# Altium footprint library SMD_SEMI.PcbLib: 101 footprints (part 3 of 7)
Each footprint in its own frame and in the unit in brackets; x right, y up, seen from the top. Pads: shape width x height; smd on the part's side, far side on the other; paste and mask are expansions set on the pad; w line width, h text height; cw(c..) or ccw(c..) is an arc to the next point about the centre after c.
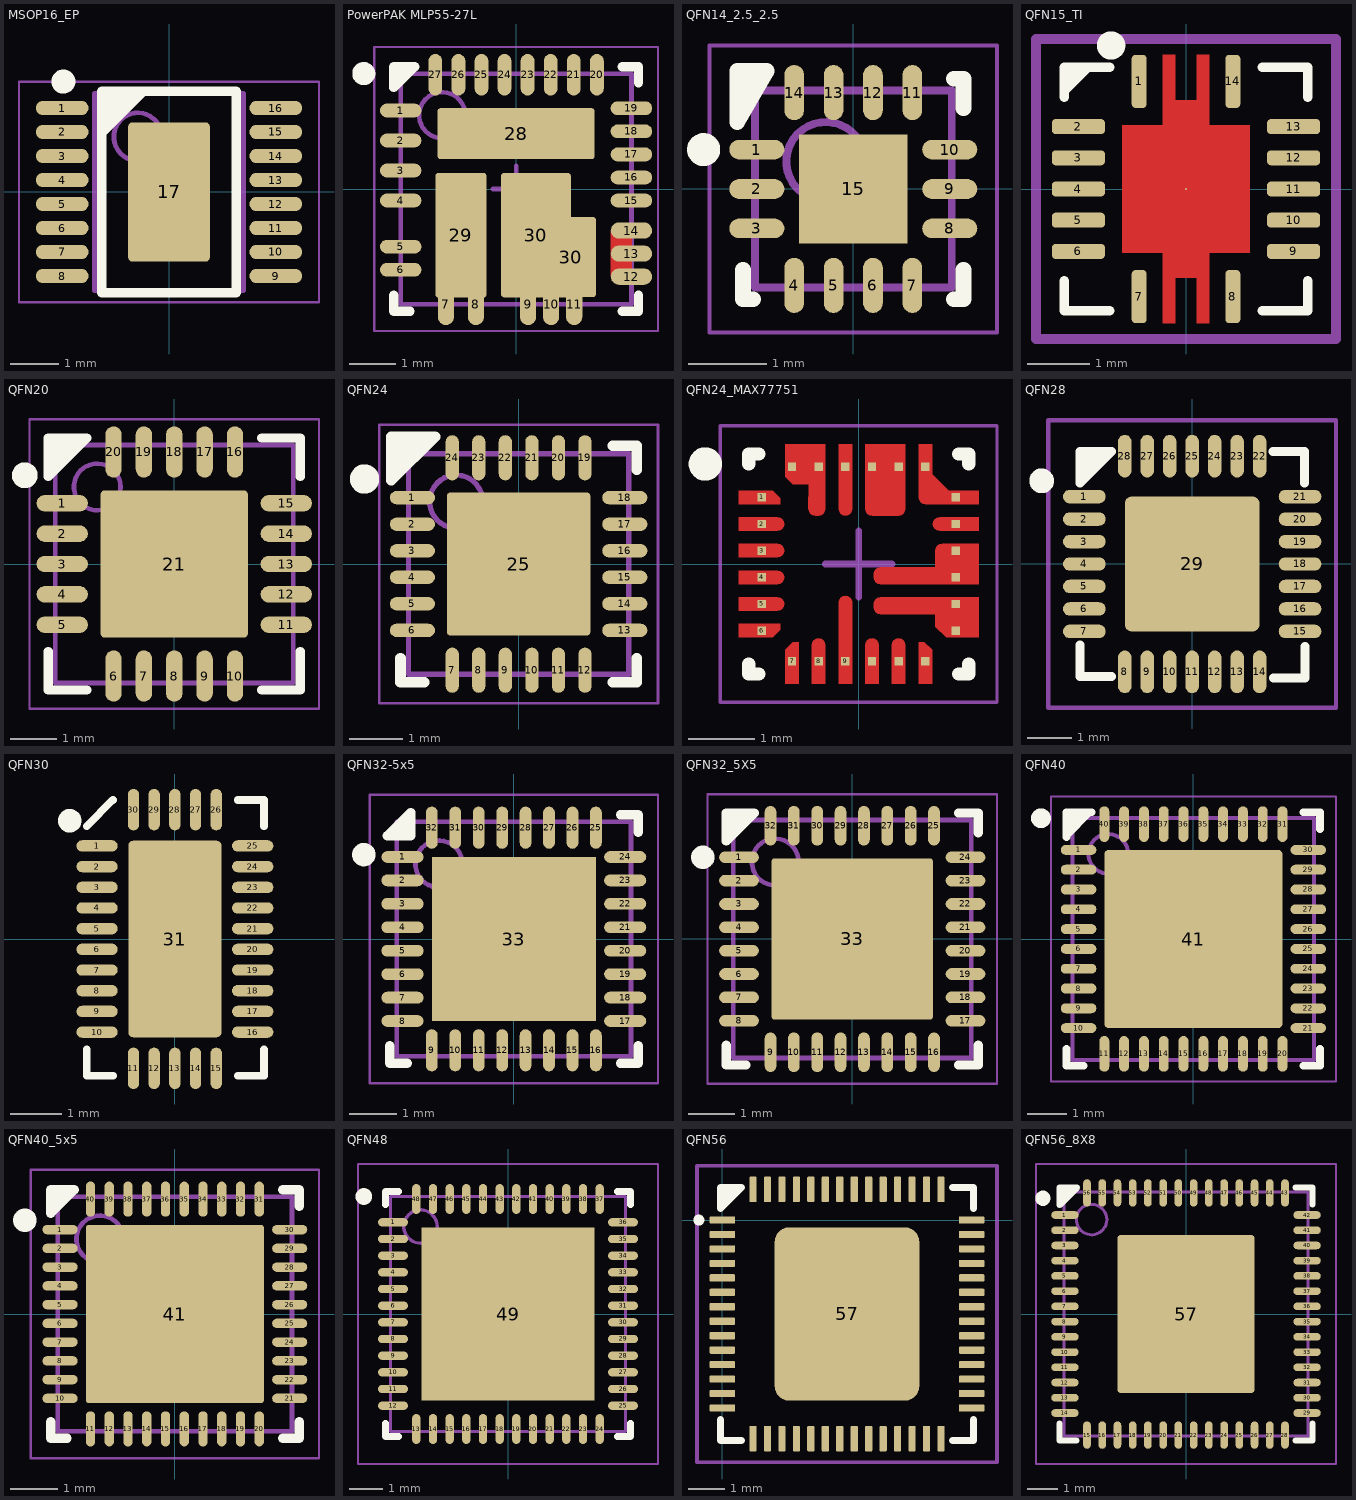
[diagram p2: the footprints below, top view; thin cyan lines are the x and y axes]

## MSOP16_EP [mm] "16-Leads, Body 4,00x3,00mm, Pitch 0,50mm"
height 0.86
pads (17):
  oval 1.1x0.3 smd: 1(-2.225,1.75) 2(-2.225,1.25) 3(-2.225,0.75) 4(-2.225,0.25) 5(-2.225,-0.25) 6(-2.225,-0.75) 7(-2.225,-1.25) 8(-2.225,-1.75) 9(2.225,-1.75) 10(2.225,-1.25) 11(2.225,-0.75) 12(2.225,-0.25) 13(2.225,0.25) 14(2.225,0.75) 15(2.225,1.25) 16(2.225,1.75)
  rrect10% 1.7x2.9 smd: 17(0,0)
Top Overlay:
  circle w0.25: c-2.2,2.3 r0.125
  region: -0.4,2.1 -1.4,1.1 -1.4,2.1
  lines w0.2: -1.4,-2.1 -1.4,2.1 1.4,2.1 1.4,-2.1 -1.4,-2.1
Mechanical 13:
  circle w0.1: c-0.65,1.15 r0.5
  lines w0.1: -1.55,-2.05 1.55,-2.05 1.55,2.05 -1.55,2.05 -1.55,-2.05
Mechanical 15:
  lines w0.05: -3.125,-2.3 3.125,-2.3 3.125,2.3 -3.125,2.3 -3.125,-2.3
  lines w0.1: -0.5,0 0.5,0 ; 0,-0.5 0,0.5
3D body "MSOP16_TP.step": height 0.86, standoff 0, extent -2.45,-2.05 2.45,2.05

## PowerPAK MLP55-27L [mm]
height 1
pads (31):
  oval 0.9x0.3 smd: 1(-2.5,1.7) 2(-2.5,1.05) 3(-2.5,0.4) 4(-2.5,-0.25) 5(-2.5,-1.25) 6(-2.5,-1.75) 15(2.5,-0.25) 16(2.5,0.25) 17(2.5,0.75) 18(2.5,1.25) 19(2.5,1.75)
  oval 0.35x0.9 smd: 7(-1.52,-2.5) 8(-0.87,-2.5) 9(0.26,-2.5) 10(0.76,-2.5) 11(1.26,-2.5)
  oval 0.9x0.35 smd: 12(2.5,-1.9) 13(2.5,-1.4) 14(2.5,-0.9)
  oval 0.3x0.9 smd: 20(1.75,2.475) 21(1.25,2.475) 22(0.75,2.475) 23(0.25,2.475) 24(-0.25,2.475) 25(-0.75,2.475) 26(-1.25,2.475) 27(-1.75,2.475)
  rrect10% 3.4x1.1 smd: 28(0,1.2)
  rrect10% 1.1x2.7 smd: 29(-1.195,-1)
  rrect10% 1.52x2.7 smd: 30(0.43,-1)
  rrect10% 1.1x1.73 smd: 30(1.18,-1.475)
Top Layer:
  rectangle: 2.05,-1.899 2.511,-0.913
Top Overlay:
  circle w0.25: c-3.3,2.5 r0.125
  rectangle: -2.65,2.425 -2.422,2.65
  lines w0.2: -2.65,-2.3 -2.65,-2.65 -2.3,-2.65 ; 2.3,-2.65 2.65,-2.65 2.65,-2.3 ; 2.3,2.65 2.65,2.65 2.65,2.3 ; -2.65,2.2 -2.65,2.65 -2.195,2.65 -2.65,2.2
Mechanical 13:
  circle w0.1: c-1.6,1.6 r0.5
  lines w0.1: -2.5,-2.5 2.5,-2.5 2.5,2.5 -2.5,2.5 -2.5,-2.5
Mechanical 15:
  lines w0.05: -3.075,-3.075 3.075,-3.075 3.075,3.075 -3.075,3.075 -3.075,-3.075
  lines w0.1: -0.5,0 0.5,0 ; 0,-0.5 0,0.5
3D body "User Library-MLP55-27L.STEP": height 0.8, standoff 0, extent -2.5,-2.5 2.501,2.5

## QFN14_2.5_2.5 [mm] "QFN, 14-Leads, Body 2.50x2.50mm, Pitch 0.50mm, Thermal Pad 1.38x1.38mm, IPC Medium Density"
height 0.8
pads (15):
  oval 0.7x0.25 smd: 1(-1.225,0.5) 2(-1.225,0) 3(-1.225,-0.5) 8(1.225,-0.5) 9(1.225,0) 10(1.225,0.5)
  oval 0.25x0.7 smd: 4(-0.75,-1.225) 5(-0.25,-1.225) 6(0.25,-1.225) 7(0.75,-1.225) 11(0.75,1.225) 12(0.25,1.225) 13(-0.25,1.225) 14(-0.75,1.225)
  rect 1.38x1.38 smd: 15(0,0)
Top Overlay:
  circle w0.25: c-1.9,0.5 r0.085
  rectangle: -1.523,1.146 -1.203,1.501
  lines w0.2: -1.4,-1.025 -1.4,-1.4 -1.275,-1.4 ; 1.275,-1.4 1.4,-1.4 1.4,-1.025 ; 1.275,1.4 1.4,1.4 1.4,1.025 ; -1.475,0.85 -1.475,1.5 -1.1,1.5 -1.475,0.85
Mechanical 13:
  circle w0.1: c-0.35,0.35 r0.5
  lines w0.1: -1.25,-1.25 1.25,-1.25 1.25,1.25 -1.25,1.25 -1.25,-1.25
Mechanical 15:
  lines w0.05: -1.825,-1.825 1.825,-1.825 1.825,1.825 -1.825,1.825 -1.825,-1.825
  lines w0.1: -0.5,0 0.5,0 ; 0,-0.5 0,0.5
3D body "QFN14_2.5_2.5.step": height 0.8, standoff 0, extent -1.3,-1.3 1.3,1.3

## QFN15_TI [mm]
pads (15):
  rrect50% 0.24x0.85 smd paste-0.412: 1(-0.75,1.725) 7(-0.75,-1.725) 8(0.75,-1.725) 14(0.75,1.725)
  rrect50% 0.85x0.24 smd paste-0.412: 2(-1.725,1) 3(-1.725,0.5) 4(-1.725,0) 5(-1.725,-0.5) 6(-1.725,-1) 9(1.725,-1) 10(1.725,-0.5) 11(1.725,0) 12(1.725,0.5) 13(1.725,1)
  round 0.025 smd paste-1.012: 15(0,0)
Top Layer:
  region: -0.375,1.025 -0.375,2.15 -0.175,2.15 -0.175,1.425 0.175,1.425 0.175,2.15 0.375,2.15 0.375,1.025 1.025,1.025 1.025,-1.025 0.375,-1.025 0.375,-2.15 0.175,-2.15 0.175,-1.425 -0.175,-1.425 -0.175,-2.15 -0.375,-2.15 -0.375,-1.025 -1.025,-1.025 -1.025,1.025
Top Overlay:
  circle w0.254: c-1.2,2.3 r0.1
  region: -1.952,1.473 -1.473,1.952 -1.952,1.952
  lines w0.152: -1.952,-1.473 -1.952,-1.952 -1.223,-1.952 ; -1.952,1.473 -1.952,1.952 -1.223,1.952 ; 1.223,-1.952 1.952,-1.952 1.952,-1.473 ; 1.223,1.952 1.952,1.952 1.952,1.473
Top Paste:
  drawing of 29 lines, arcs and shapes, not listed
Top Solder:
  region: -0.375,-1.025 0.375,-1.025 0.375,-2.15 0.175,-2.15 0.175,-1.425 -0.175,-1.425 -0.175,-2.15 -0.375,-2.15
  region: -0.375,-1.025 0.375,-1.025 0.375,-2.15 0.175,-2.15 0.175,-1.425 -0.175,-1.425 -0.175,-2.15 -0.375,-2.15
  region: -0.375,1.025 0.375,1.025 0.375,2.15 0.175,2.15 0.175,1.425 -0.175,1.425 -0.175,2.15 -0.375,2.15
  region: -0.375,1.025 0.375,1.025 0.375,2.15 0.175,2.15 0.175,1.525 -0.175,1.525 -0.175,2.15 -0.375,2.15
Mechanical 15:
  lines w0.152: -2.404,-2.404 2.404,-2.404 2.404,2.404 -2.404,2.404 -2.404,-2.404
3D body "RHL14_2P05X2P05.step": height 0.74, standoff 0, extent -1.876,-1.876 1.876,1.876

## QFN20 [mm] "QFN, 20-Leads, Body 5.00x5.00mm, Pitch 0.65mm, Thermal Pad 3.15x3.15mm, IPC Medium Density"
height 1
pads (21):
  oval 1.1x0.35 smd: 1(-2.4,1.3) 2(-2.4,0.65) 3(-2.4,0) 4(-2.4,-0.65) 5(-2.4,-1.3) 11(2.4,-1.3) 12(2.4,-0.65) 13(2.4,0) 14(2.4,0.65) 15(2.4,1.3)
  oval 0.35x1.1 smd: 6(-1.3,-2.4) 7(-0.65,-2.4) 8(0,-2.4) 9(0.65,-2.4) 10(1.3,-2.4) 16(1.3,2.4) 17(0.65,2.4) 18(0,2.4) 19(-0.65,2.4) 20(-1.3,2.4)
  rrect5% 3.15x3.15 smd: 21(0,0)
Top Overlay:
  circle w0.3: c-3.2,1.9 r0.125
  region: -1.806,2.7 -2.7,1.806 -2.7,2.7
  lines w0.2: -2.7,-1.875 -2.7,-2.7 -1.875,-2.7 ; 1.875,-2.7 2.7,-2.7 2.7,-1.875 ; 1.875,2.7 2.7,2.7 2.7,1.875 ; -2.7,1.875 -2.7,2.7 -1.875,2.7 -2.7,1.875
Mechanical 13:
  circle w0.1: c-1.65,1.65 r0.5
  lines w0.1: -2.55,-2.55 2.55,-2.55 2.55,2.55 -2.55,2.55 -2.55,-2.55
Mechanical 15:
  lines w0.05: -3.1,-3.1 3.1,-3.1 3.1,3.1 -3.1,3.1 -3.1,-3.1
  lines w0.1: -0.5,0 0.5,0 ; 0,-0.5 0,0.5
3D body "QFN20.step": height 1, standoff 0, extent -2.56,-2.56 2.56,2.56

## QFN24 [mm]
height 0.8
pads (25):
  oval 0.85x0.25 smd: 1(-2,1.25) 2(-2,0.75) 3(-2,0.25) 4(-2,-0.25) 5(-2,-0.75) 6(-2,-1.25) 13(2,-1.25) 14(2,-0.75) 15(2,-0.25) 16(2,0.25) 17(2,0.75) 18(2,1.25)
  oval 0.25x0.85 smd: 7(-1.25,-2) 8(-0.75,-2) 9(-0.25,-2) 10(0.25,-2) 11(0.75,-2) 12(1.25,-2) 19(1.25,2) 20(0.75,2) 21(0.25,2) 22(-0.25,2) 23(-0.75,2) 24(-1.25,2)
  rrect5% 2.7x2.7 smd: 25(0,0)
Top Overlay:
  circle w0.3: c-2.9,1.6 r0.125
  region: -1.506,2.4 -2.4,1.506 -2.4,2.4
  lines w0.2: -2.225,-1.775 -2.225,-2.225 -1.775,-2.225 ; -2.225,1.775 -2.225,2.225 -1.775,2.225 ; 1.775,-2.225 2.225,-2.225 2.225,-1.775 ; 1.775,2.225 2.225,2.225 2.225,1.775 ; -2.4,1.575 -1.575,2.4 -2.4,2.4 -2.4,1.575
Mechanical 13:
  circle w0.1: c-1.175,1.175 r0.5
  lines w0.1: -2.075,-2.075 2.075,-2.075 2.075,2.075 -2.075,2.075 -2.075,-2.075
Mechanical 15:
  lines w0.05: -2.625,-2.625 2.625,-2.625 2.625,2.625 -2.625,2.625 -2.625,-2.625
  lines w0.1: -0.5,0 0.5,0 ; 0,-0.5 0,0.5
3D body "QFN24.step": height 0.8, standoff 0, extent -2.085,-2.085 2.085,2.085

## QFN24_MAX77751 [mil] "QFN, 24-Leads, Body 3.00x3.00mm, Pitch 0.40mm, IPC Medium Density"
height 23.62
pads (24):
  rect 5x5 smd: 1(-57.36,39.37) 2(-57.36,23.62) 3(-57.36,7.87) 4(-57.36,-7.87) 5(-57.36,-23.62) 6(-57.36,-39.37) 7(-39.37,-57.36) 8(-23.62,-57.36) 9(-7.87,-57.36) 10(7.87,-57.36) 11(23.62,-57.36) 12(39.37,-57.36) 13(57.36,-39.37) 14(57.36,-23.62) 15(57.36,-7.87) 16(57.36,7.87) 17(57.36,23.62) 18(57.36,39.37) 19(39.37,57.36) 20(23.62,57.36) 21(7.87,57.36) 22(-7.87,57.36) 23(-23.62,57.36) 24(-39.37,57.36)
Top Layer:
  region: -27.62,-47.88 -27.62,-70.86 -19.62,-70.86 -19.62,-47.88 -19.93,-46.35 -20.79,-45.05 -22.09,-44.18 -23.62,-43.88 -25.15,-44.18 -26.45,-45.05 -27.32,-46.35
  region: 3.87,-47.88 3.87,-70.86 11.87,-70.86 11.87,-47.88 11.57,-46.35 10.7,-45.05 9.4,-44.18 7.87,-43.88 6.34,-44.18 5.05,-45.05 4.18,-46.35
  region: 19.62,-47.88 19.62,-70.86 27.62,-70.86 27.62,-47.88 27.32,-46.35 26.45,-45.05 25.15,-44.18 23.62,-43.88 22.09,-44.18 20.79,-45.05 19.93,-46.35
  region: -11.87,-22.68 -11.87,-70.86 -3.87,-70.86 -3.87,-22.68 -4.18,-21.15 -5.05,-19.85 -6.34,-18.99 -7.87,-18.68 -9.4,-18.99 -10.7,-19.85 -11.57,-21.15
  region: -3.87,32.56 -3.87,70.86 -11.87,70.86 -11.87,32.56 -11.57,31.03 -10.7,29.73 -9.4,28.87 -7.87,28.56 -6.34,28.87 -5.05,29.73 -4.18,31.03
  region: -70.86,-35.37 -46.26,-35.37 -46.26,-38.83 -50.67,-43.37 -70.86,-43.37
  region: 35.37,-70.86 35.37,-46.26 38.83,-46.26 43.37,-50.67 43.37,-70.86
  region: -70.86,35.37 -46.26,35.37 -46.26,38.83 -50.67,43.37 -70.86,43.37
  region: -35.37,-70.86 -35.37,-46.26 -38.83,-46.26 -43.37,-50.67 -43.37,-70.86
  region: -47.88,27.62 -70.86,27.62 -70.86,19.62 -47.88,19.62 -46.35,19.93 -45.05,20.79 -44.18,22.09 -43.88,23.62 -44.18,25.15 -45.05,26.45 -46.35,27.32
  region: -47.88,11.87 -70.86,11.87 -70.86,3.87 -47.88,3.87 -46.35,4.18 -45.05,5.05 -44.18,6.34 -43.88,7.87 -44.18,9.4 -45.05,10.7 -46.35,11.57
  region: -47.88,-3.87 -70.86,-3.87 -70.86,-11.87 -47.88,-11.87 -46.35,-11.57 -45.05,-10.7 -44.18,-9.4 -43.88,-7.87 -44.18,-6.34 -45.05,-5.05 -46.35,-4.18
  region: -47.88,-19.62 -70.86,-19.62 -70.86,-27.62 -47.88,-27.62 -46.35,-27.32 -45.05,-26.45 -44.18,-25.15 -43.88,-23.62 -44.18,-22.09 -45.05,-20.79 -46.35,-19.93
  region: 47.88,19.62 70.86,19.62 70.86,27.62 47.88,27.62 46.35,27.32 45.05,26.45 44.18,25.15 43.88,23.62 44.18,22.09 45.05,20.79 46.35,19.93
  region: 3.87,32.56 3.87,70.86 27.62,70.86 27.62,32.56 27.32,31.03 26.45,29.73 25.15,28.87 23.62,28.56 7.87,28.56 6.34,28.87 5.05,29.73 4.18,31.03
  region: -43.37,51.65 -43.37,70.86 -19.62,70.86 -19.62,32.56 -19.93,31.03 -20.79,29.73 -22.09,28.87 -23.62,28.56 -25.63,28.56 -27.16,28.87 -28.46,29.73 -29.33,31.03 -29.63,32.56 -29.62,47.24 -38.96,47.24
  region: 51.65,-43.37 70.86,-43.37 70.86,-19.62 12.88,-19.62 11.35,-19.93 10.05,-20.79 9.18,-22.09 8.88,-23.62 8.88,-25.63 9.18,-27.16 10.05,-28.46 11.35,-29.33 12.88,-29.63 45.27,-29.62 45.27,-36.99
  region: 49.26,11.87 70.86,11.87 70.86,-11.87 12.88,-11.87 11.35,-11.57 10.05,-10.7 9.18,-9.4 8.88,-7.87 8.88,-5.87 9.18,-4.34 10.05,-3.04 11.35,-2.17 12.88,-1.87 45.27,-1.87 45.26,7.87 45.56,9.4 46.43,10.7 47.73,11.57
  region: 35.37,43.86 35.37,70.86 43.37,70.86 43.37,53.15 53.15,43.37 70.86,43.37 70.86,35.37 43.86,35.37 39.41,35.37 37.88,35.67 36.59,36.54 35.72,37.84 35.41,39.37
  region: -70.86,-35.37 -46.26,-35.37 -46.26,-38.83 -50.67,-43.37 -70.86,-43.37
Top Overlay:
  circle w9.84: c-90.55,59.06 r4.92
  lines w7.87: -64.96,-59.06 -64.96,-64.96 -59.06,-64.96 ; -64.96,59.06 -64.96,64.96 -59.06,64.96 ; 59.06,-64.96 64.96,-64.96 64.96,-59.06 ; 59.06,64.96 64.96,64.96 64.96,59.06
Mechanical 15:
  lines w1.97: -81.69,-81.69 -81.69,81.69 81.69,81.69 81.69,-81.69 -81.69,-81.69
  lines w3.94: -19.68,0 19.68,0 ; 0,-19.68 0,19.68
3D body "QFN24_MAX77751.step": height 23.62, standoff 0, extent -59.45,-59.45 59.45,59.45

## QFN28 [mm]
height 1.6
pads (29):
  oval 0.95x0.3 smd: 1(-2.4,1.5) 2(-2.4,1) 3(-2.4,0.5) 4(-2.4,0) 5(-2.4,-0.5) 6(-2.4,-1) 7(-2.4,-1.5) 15(2.4,-1.5) 16(2.4,-1) 17(2.4,-0.5) 18(2.4,0) 19(2.4,0.5) 20(2.4,1) 21(2.4,1.5)
  oval 0.3x0.95 smd: 8(-1.5,-2.4) 9(-1,-2.4) 10(-0.5,-2.4) 11(0,-2.4) 12(0.5,-2.4) 13(1,-2.4) 14(1.5,-2.4) 22(1.5,2.4) 23(1,2.4) 24(0.5,2.4) 25(0,2.4) 26(-0.5,2.4) 27(-1,2.4) 28(-1.5,2.4)
  rrect10% 3x3 smd: 29(0,0)
Top Overlay:
  circle w0.3: c-3.35,1.85 r0.125
  region: -2.5,2.5 -1.8,2.5 -2.5,1.8
  lines w0.2: -2.5,-1.8 -2.5,-2.5 -1.8,-2.5 ; 1.8,2.5 2.5,2.5 2.5,1.8 ; 1.814,-2.535 2.514,-2.535 2.514,-1.835 ; -2.5,1.8 -1.8,2.5 -2.5,2.5 -2.5,1.8
Top Component Outline:
  lines w0.1: -3.2,-3.2 -3.2,3.2 3.2,3.2 3.2,-3.2 -3.2,-3.2
3D body "User Library-QFN28-0_5.STEP": height 1, standoff 0, extent -2.5,-2.5 2.5,2.5

## QFN30 [mm]
pads (31):
  oval 0.8x0.22 smd: 1(-1.505,1.8) 2(-1.505,1.4) 3(-1.505,1) 4(-1.505,0.6) 5(-1.505,0.2) 6(-1.505,-0.2) 7(-1.505,-0.6) 8(-1.505,-1) 9(-1.505,-1.4) 10(-1.505,-1.8) 16(1.505,-1.8) 17(1.505,-1.4) 18(1.505,-1) 19(1.505,-0.6) 20(1.505,-0.2) 21(1.505,0.2) 22(1.505,0.6) 23(1.505,1) 24(1.505,1.4) 25(1.505,1.8)
  oval 0.22x0.8 smd: 11(-0.8,-2.5) 12(-0.4,-2.5) 13(0,-2.5) 14(0.4,-2.5) 15(0.8,-2.5) 26(0.8,2.5) 27(0.4,2.5) 28(0,2.5) 29(-0.4,2.5) 30(-0.8,2.5)
  rrect10% 1.8x3.8 smd paste-1: 31(0,0)
Top Overlay:
  circle w0.254: c-2.032,2.286 r0.1
  lines w0.15: -1.706,-2.137 -1.706,-2.645 -1.198,-2.645 ; -1.706,2.181 -1.198,2.689 ; 1.215,-2.645 1.723,-2.645 1.723,-2.137 ; 1.215,2.689 1.723,2.689 1.723,2.181
Top Paste:
  rectangle: -0.625,0.8 0.675,1.7
  rectangle: -0.625,-0.5 0.675,0.5
  rectangle: -0.625,-1.7 0.675,-0.8
3D body: height 0.8, standoff 0.05, extent -1.652,-2.652 1.652,2.652

## QFN32-5x5 [mm] "QFN, 32-Leads, Body 5.00x5.00mm, Pitch 0.50mm, Thermal Pad 3.50x3.50mm, IPC Medium Density"
height 0.75
pads (33):
  oval 0.9x0.25 smd: 1(-2.375,1.75) 2(-2.375,1.25) 3(-2.375,0.75) 4(-2.375,0.25) 5(-2.375,-0.25) 6(-2.375,-0.75) 7(-2.375,-1.25) 8(-2.375,-1.75) 17(2.375,-1.75) 18(2.375,-1.25) 19(2.375,-0.75) 20(2.375,-0.25) 21(2.375,0.25) 22(2.375,0.75) 23(2.375,1.25) 24(2.375,1.75)
  oval 0.25x0.9 smd: 9(-1.75,-2.375) 10(-1.25,-2.375) 11(-0.75,-2.375) 12(-0.25,-2.375) 13(0.25,-2.375) 14(0.75,-2.375) 15(1.25,-2.375) 16(1.75,-2.375) 25(1.75,2.375) 26(1.25,2.375) 27(0.75,2.375) 28(0.25,2.375) 29(-0.25,2.375) 30(-0.75,2.375) 31(-1.25,2.375) 32(-1.75,2.375)
  rect 3.5x3.5 smd: 33(0,0)
Top Overlay:
  circle w0.25: c-3.2,1.8 r0.125
  region: -2.7,2.2 -2.2,2.7 -2.2,2.2
  lines w0.2: -2.65,-2.275 -2.65,-2.65 -2.275,-2.65 ; 2.275,-2.65 2.65,-2.65 2.65,-2.275 ; 2.275,2.65 2.65,2.65 2.65,2.275 ; -2.7,2.2 -2.2,2.7 -2.2,2.2 -2.7,2.2
Mechanical 13:
  circle w0.1: c-1.6,1.6 r0.5
  lines w0.1: -2.5,-2.5 2.5,-2.5 2.5,2.5 -2.5,2.5 -2.5,-2.5
Mechanical 15:
  lines w0.05: -3.075,-3.075 3.075,-3.075 3.075,3.075 -3.075,3.075 -3.075,-3.075
  lines w0.1: -0.5,0 0.5,0 ; 0,-0.5 0,0.5
3D body "QFN32-5x5.step": height 0.75, standoff 0, extent -2.51,-2.51 2.51,2.51

## QFN32_5X5 [mm]
height 1
pads (33):
  oval 0.85x0.25 smd: 1(-2.425,1.75) 2(-2.425,1.25) 3(-2.425,0.75) 4(-2.425,0.25) 5(-2.425,-0.25) 6(-2.425,-0.75) 7(-2.425,-1.25) 8(-2.425,-1.75) 17(2.425,-1.75) 18(2.425,-1.25) 19(2.425,-0.75) 20(2.425,-0.25) 21(2.425,0.25) 22(2.425,0.75) 23(2.425,1.25) 24(2.425,1.75)
  oval 0.25x0.85 smd: 9(-1.75,-2.425) 10(-1.25,-2.425) 11(-0.75,-2.425) 12(-0.25,-2.425) 13(0.25,-2.425) 14(0.75,-2.425) 15(1.25,-2.425) 16(1.75,-2.425) 25(1.75,2.425) 26(1.25,2.425) 27(0.75,2.425) 28(0.25,2.425) 29(-0.25,2.425) 30(-0.75,2.425) 31(-1.25,2.425) 32(-1.75,2.425)
  rrect3% 3.45x3.45 smd: 33(0,0)
Top Overlay:
  circle w0.25: c-3.2,1.75 r0.125
  region: -2.1,2.7 -2.7,2.1 -2.7,2.7
  lines w0.2: -2.7,-2.275 -2.7,-2.7 -2.275,-2.7 ; 2.275,-2.7 2.7,-2.7 2.7,-2.275 ; 2.275,2.7 2.7,2.7 2.7,2.275 ; -2.7,2.1 -2.1,2.7 -2.7,2.7 -2.7,2.1
Mechanical 13:
  circle w0.1: c-1.65,1.65 r0.5
  lines w0.1: -2.55,-2.55 -2.55,2.55 2.55,2.55 2.55,-2.55 -2.55,-2.55
Mechanical 15:
  lines w0.05: -3.1,-3.1 -3.1,3.1 3.1,3.1 3.1,-3.1 -3.1,-3.1
  lines w0.1: -0.5,0 0.5,0 ; 0,-0.5 0,0.5
3D body "QFN32_5X5.step": height 1, standoff 0, extent -2.56,-2.56 2.56,2.56

## QFN40 [mm]
height 1
pads (41):
  oval 0.9x0.25 smd: 1(-2.9,2.25) 2(-2.9,1.75) 3(-2.9,1.25) 4(-2.9,0.75) 5(-2.9,0.25) 6(-2.9,-0.25) 7(-2.9,-0.75) 8(-2.9,-1.25) 9(-2.9,-1.75) 10(-2.9,-2.25) 21(2.9,-2.25) 22(2.9,-1.75) 23(2.9,-1.25) 24(2.9,-0.75) 25(2.9,-0.25) 26(2.9,0.25) 27(2.9,0.75) 28(2.9,1.25) 29(2.9,1.75) 30(2.9,2.25)
  oval 0.25x0.9 smd: 11(-2.25,-2.9) 12(-1.75,-2.9) 13(-1.25,-2.9) 14(-0.75,-2.9) 15(-0.25,-2.9) 16(0.25,-2.9) 17(0.75,-2.9) 18(1.25,-2.9) 19(1.75,-2.9) 20(2.25,-2.9) 31(2.25,2.9) 32(1.75,2.9) 33(1.25,2.9) 34(0.75,2.9) 35(0.25,2.9) 36(-0.25,2.9) 37(-0.75,2.9) 38(-1.25,2.9) 39(-1.75,2.9) 40(-2.25,2.9)
  rrect5% 4.5x4.5 smd: 41(0,0)
Top Overlay:
  circle w0.25: c-3.85,3.05 r0.125
  region: -2.499,3.2 -3.2,2.499 -3.2,3.2
  lines w0.2: -3.2,-2.775 -3.2,-3.2 -2.775,-3.2 ; -3.2,2.575 -3.2,3.2 -2.575,3.2 ; 2.775,-3.2 3.2,-3.2 3.2,-2.775 ; 2.775,3.2 3.2,3.2 3.2,2.775
Mechanical 13:
  circle w0.1: c-2.15,2.15 r0.5
  lines w0.1: -3.05,-3.05 -3.05,3.05 3.05,3.05 3.05,-3.05 -3.05,-3.05
Mechanical 15:
  lines w0.05: -3.6,-3.6 -3.6,3.6 3.6,3.6 3.6,-3.6 -3.6,-3.6
  lines w0.1: -0.5,0 0.5,0 ; 0,-0.5 0,0.5
3D body "QFN40.step": height 1, standoff 0, extent -3.06,-3.06 3.06,3.06

## QFN40_5x5 [mm]
height 0.75
pads (41):
  oval 0.75x0.2 smd: 1(-2.45,1.8) 2(-2.45,1.4) 3(-2.45,1) 4(-2.45,0.6) 5(-2.45,0.2) 6(-2.45,-0.2) 7(-2.45,-0.6) 8(-2.45,-1) 9(-2.45,-1.4) 10(-2.45,-1.8) 21(2.45,-1.8) 22(2.45,-1.4) 23(2.45,-1) 24(2.45,-0.6) 25(2.45,-0.2) 26(2.45,0.2) 27(2.45,0.6) 28(2.45,1) 29(2.45,1.4) 30(2.45,1.8)
  oval 0.2x0.75 smd: 11(-1.8,-2.45) 12(-1.4,-2.45) 13(-1,-2.45) 14(-0.6,-2.45) 15(-0.2,-2.45) 16(0.2,-2.45) 17(0.6,-2.45) 18(1,-2.45) 19(1.4,-2.45) 20(1.8,-2.45) 31(1.8,2.45) 32(1.4,2.45) 33(1,2.45) 34(0.6,2.45) 35(0.2,2.45) 36(-0.2,2.45) 37(-0.6,2.45) 38(-1,2.45) 39(-1.4,2.45) 40(-1.8,2.45)
  rrect3% 3.8x3.8 smd: 41(0,0)
Top Overlay:
  circle w0.25: c-3.2,2 r0.125
  region: -2.65,2.65 -2.15,2.65 -2.65,2.15
  lines w0.2: -2.65,-2.3 -2.65,-2.65 -2.3,-2.65 ; 2.3,-2.65 2.65,-2.65 2.65,-2.3 ; 2.3,2.65 2.65,2.65 2.65,2.3 ; -2.65,2.15 -2.65,2.65 -2.15,2.65 -2.65,2.15
Mechanical 13:
  circle w0.1: c-1.6,1.6 r0.5
  lines w0.1: -2.5,-2.5 -2.5,2.5 2.5,2.5 2.5,-2.5 -2.5,-2.5
Mechanical 15:
  lines w0.05: -3.075,-3.075 -3.075,3.075 3.075,3.075 3.075,-3.075 -3.075,-3.075
  lines w0.1: -0.5,0 0.5,0 ; 0,-0.5 0,0.5
3D body "QFN40_5x5.step": height 0.75, standoff 0, extent -2.51,-2.51 2.51,2.51

## QFN48 [mm] "QFN, 48-Leads, Body 7x7mm, Pitch 0.5mm, Thermal Pad 5.2x5.2mm, IPC Low Density"
height 1
pads (49):
  oval 0.9x0.25 smd: 1(-3.45,2.75) 2(-3.45,2.25) 3(-3.45,1.75) 4(-3.45,1.25) 5(-3.45,0.75) 6(-3.45,0.25) 7(-3.45,-0.25) 8(-3.45,-0.75) 9(-3.45,-1.25) 10(-3.45,-1.75) 11(-3.45,-2.25) 12(-3.45,-2.75) 25(3.45,-2.75) 26(3.45,-2.25) 27(3.45,-1.75) 28(3.45,-1.25) 29(3.45,-0.75) 30(3.45,-0.25) 31(3.45,0.25) 32(3.45,0.75) 33(3.45,1.25) 34(3.45,1.75) 35(3.45,2.25) 36(3.45,2.75)
  oval 0.25x0.9 smd: 13(-2.75,-3.45) 14(-2.25,-3.45) 15(-1.75,-3.45) 16(-1.25,-3.45) 17(-0.75,-3.45) 18(-0.25,-3.45) 19(0.25,-3.45) 20(0.75,-3.45) 21(1.25,-3.45) 22(1.75,-3.45) 23(2.25,-3.45) 24(2.75,-3.45) 37(2.75,3.45) 38(2.25,3.45) 39(1.75,3.45) 40(1.25,3.45) 41(0.75,3.45) 42(0.25,3.45) 43(-0.25,3.45) 44(-0.75,3.45) 45(-1.25,3.45) 46(-1.75,3.45) 47(-2.25,3.45) 48(-2.75,3.45)
  rect 5.2x5.2 smd: 49(0,0)
Top Overlay:
  circle w0.25: c-4.325,3.525 r0.125
  lines w0.2: -3.675,-3.275 -3.675,-3.675 -3.275,-3.675 ; -3.675,3.275 -3.675,3.675 -3.275,3.675 ; 3.275,-3.675 3.675,-3.675 3.675,-3.275 ; 3.275,3.675 3.675,3.675 3.675,3.275
Mechanical 13:
  circle w0.1: c-2.625,2.625 r0.5
  lines w0.1: -3.525,-3.525 -3.525,3.525 3.525,3.525 3.525,-3.525 -3.525,-3.525
Mechanical 15:
  lines w0.05: -4.5,-4.5 -4.5,4.5 4.5,4.5 4.5,-4.5 -4.5,-4.5
  lines w0.1: -0.5,0 0.5,0 ; 0,-0.5 0,0.5
3D body "User Library-QFN48_7x7.step": height 0.8, standoff 0, extent -3.51,-3.51 3.51,3.51

## QFN56 [mm]
pads (57):
  rrect25% 0.7x0.2 smd: 1(0,0) 2(0,-0.4) 3(0,-0.8) 4(0,-1.2) 5(0,-1.6) 6(0,-2) 7(0,-2.4) 8(0,-2.8) 9(0,-3.2) 10(0,-3.6) 11(0,-4) 12(0,-4.4) 13(0,-4.8) 14(0,-5.2) 29(6.9,-5.2) 30(6.9,-4.8) 31(6.9,-4.4) 32(6.9,-4) 33(6.9,-3.6) 34(6.9,-3.2) 35(6.9,-2.8) 36(6.9,-2.4) 37(6.9,-2) 38(6.9,-1.6) 39(6.9,-1.2) 40(6.9,-0.8) 41(6.9,-0.4) 42(6.9,0)
  rrect25% 0.2x0.7 smd: 15(0.85,-6.05) 16(1.25,-6.05) 17(1.65,-6.05) 18(2.05,-6.05) 19(2.45,-6.05) 20(2.85,-6.05) 21(3.25,-6.05) 22(3.65,-6.05) 23(4.05,-6.05) 24(4.45,-6.05) 25(4.85,-6.05) 26(5.25,-6.05) 27(5.65,-6.05) 28(6.05,-6.05) 43(6.05,0.85) 44(5.65,0.85) 45(5.25,0.85) 46(4.85,0.85) 47(4.45,0.85) 48(4.05,0.85) 49(3.65,0.85) 50(3.25,0.85) 51(2.85,0.85) 52(2.45,0.85) 53(2.05,0.85) 54(1.65,0.85) 55(1.25,0.85) 56(0.85,0.85)
  rrect20% 4x4.8 smd: 57(3.45,-2.6)
Top Overlay:
  circle w0.254: c-0.65,0 r0.025
  region: -0.05,0.25 -0.05,0.9 0.6,0.9
  lines w0.2: -0.05,-5.525 -0.05,-6.1 0.525,-6.1 ; 6.375,-6.1 6.95,-6.1 6.95,-5.525 ; 6.375,0.9 6.95,0.9 6.95,0.325 ; -0.05,0.325 -0.05,0.9 0.525,0.9 -0.05,0.325
Mechanical 15:
  lines w0.1: -0.7,-6.7 4.1,-6.7 7.6,-6.7 7.6,-6.1 7.6,1.5 6.8,1.5 -0.7,1.5 -0.7,0.5 -0.7,-6.7
3D body "User Library-QFN56_0_4.step": height 0.8, standoff 0, extent -0.05,-6.1 6.95,0.9

## QFN56_8X8 [mm]
height 0.9
pads (57):
  oval 0.9x0.25 smd: 1(-3.975,3.25) 2(-3.975,2.75) 3(-3.975,2.25) 4(-3.975,1.75) 5(-3.975,1.25) 6(-3.975,0.75) 7(-3.975,0.25) 8(-3.975,-0.25) 9(-3.975,-0.75) 10(-3.975,-1.25) 11(-3.975,-1.75) 12(-3.975,-2.25) 13(-3.975,-2.75) 14(-3.975,-3.25) 29(3.975,-3.25) 30(3.975,-2.75) 31(3.975,-2.25) 32(3.975,-1.75) 33(3.975,-1.25) 34(3.975,-0.75) 35(3.975,-0.25) 36(3.975,0.25) 37(3.975,0.75) 38(3.975,1.25) 39(3.975,1.75) 40(3.975,2.25) 41(3.975,2.75) 42(3.975,3.25)
  oval 0.25x0.9 smd: 15(-3.25,-3.975) 16(-2.75,-3.975) 17(-2.25,-3.975) 18(-1.75,-3.975) 19(-1.25,-3.975) 20(-0.75,-3.975) 21(-0.25,-3.975) 22(0.25,-3.975) 23(0.75,-3.975) 24(1.25,-3.975) 25(1.75,-3.975) 26(2.25,-3.975) 27(2.75,-3.975) 28(3.25,-3.975) 43(3.25,3.975) 44(2.75,3.975) 45(2.25,3.975) 46(1.75,3.975) 47(1.25,3.975) 48(0.75,3.975) 49(0.25,3.975) 50(-0.25,3.975) 51(-0.75,3.975) 52(-1.25,3.975) 53(-1.75,3.975) 54(-2.25,3.975) 55(-2.75,3.975) 56(-3.25,3.975)
  rrect5% 4.5x5.2 smd: 57(0,0)
Top Overlay:
  circle w0.25: c-4.7,3.8 r0.125
  region: -4.15,3.5 -4.15,4.15 -3.5,4.15
  lines w0.2: -4.15,-3.775 -4.15,-4.15 ; -4.15,-3.6 -4.15,-4.15 ; -4.15,3.775 -4.15,4.15 ; -3.775,-4.15 -4.15,-4.15 ; -3.775,4.15 -4.15,4.15 ; -3.6,-4.15 -4.15,-4.15 ; 3.6,-4.15 4.15,-4.15 ; 3.6,4.15 4.15,4.15 ; 3.775,-4.15 4.15,-4.15 ; 3.775,4.15 4.15,4.15 ; 4.15,-3.775 4.15,-4.15 ; 4.15,-3.6 4.15,-4.15 ; 4.15,3.6 4.15,4.15 ; 4.15,3.775 4.15,4.15 ; -4.15,4.15 -4.15,3.575 -3.575,4.15 -4.15,4.15
Mechanical 13:
  circle w0.1: c-3.1,3.1 r0.5
  lines w0.1: -4,-4 4,-4 4,4 -4,4 -4,-4
Mechanical 15:
  lines w0.05: -4.925,-4.925 4.925,-4.925 4.925,4.925 -4.925,4.925 -4.925,-4.925
  lines w0.1: -0.5,0 0.5,0 ; 0,-0.5 0,0.5
3D body "QFN56_8X8.step": height 0.9, standoff 0, extent -4.01,-4.01 4.01,4.01